# Altium footprint library Connectors.PcbLib: 70 footprints (part 3 of 5)
Each footprint in its own frame and in the unit in brackets; x right, y up, seen from the top. Pads: shape width x height; smd on the part's side, far side on the other; paste and mask are expansions set on the pad; w line width, h text height; cw(c..) or ccw(c..) is an arc to the next point about the centre after c.
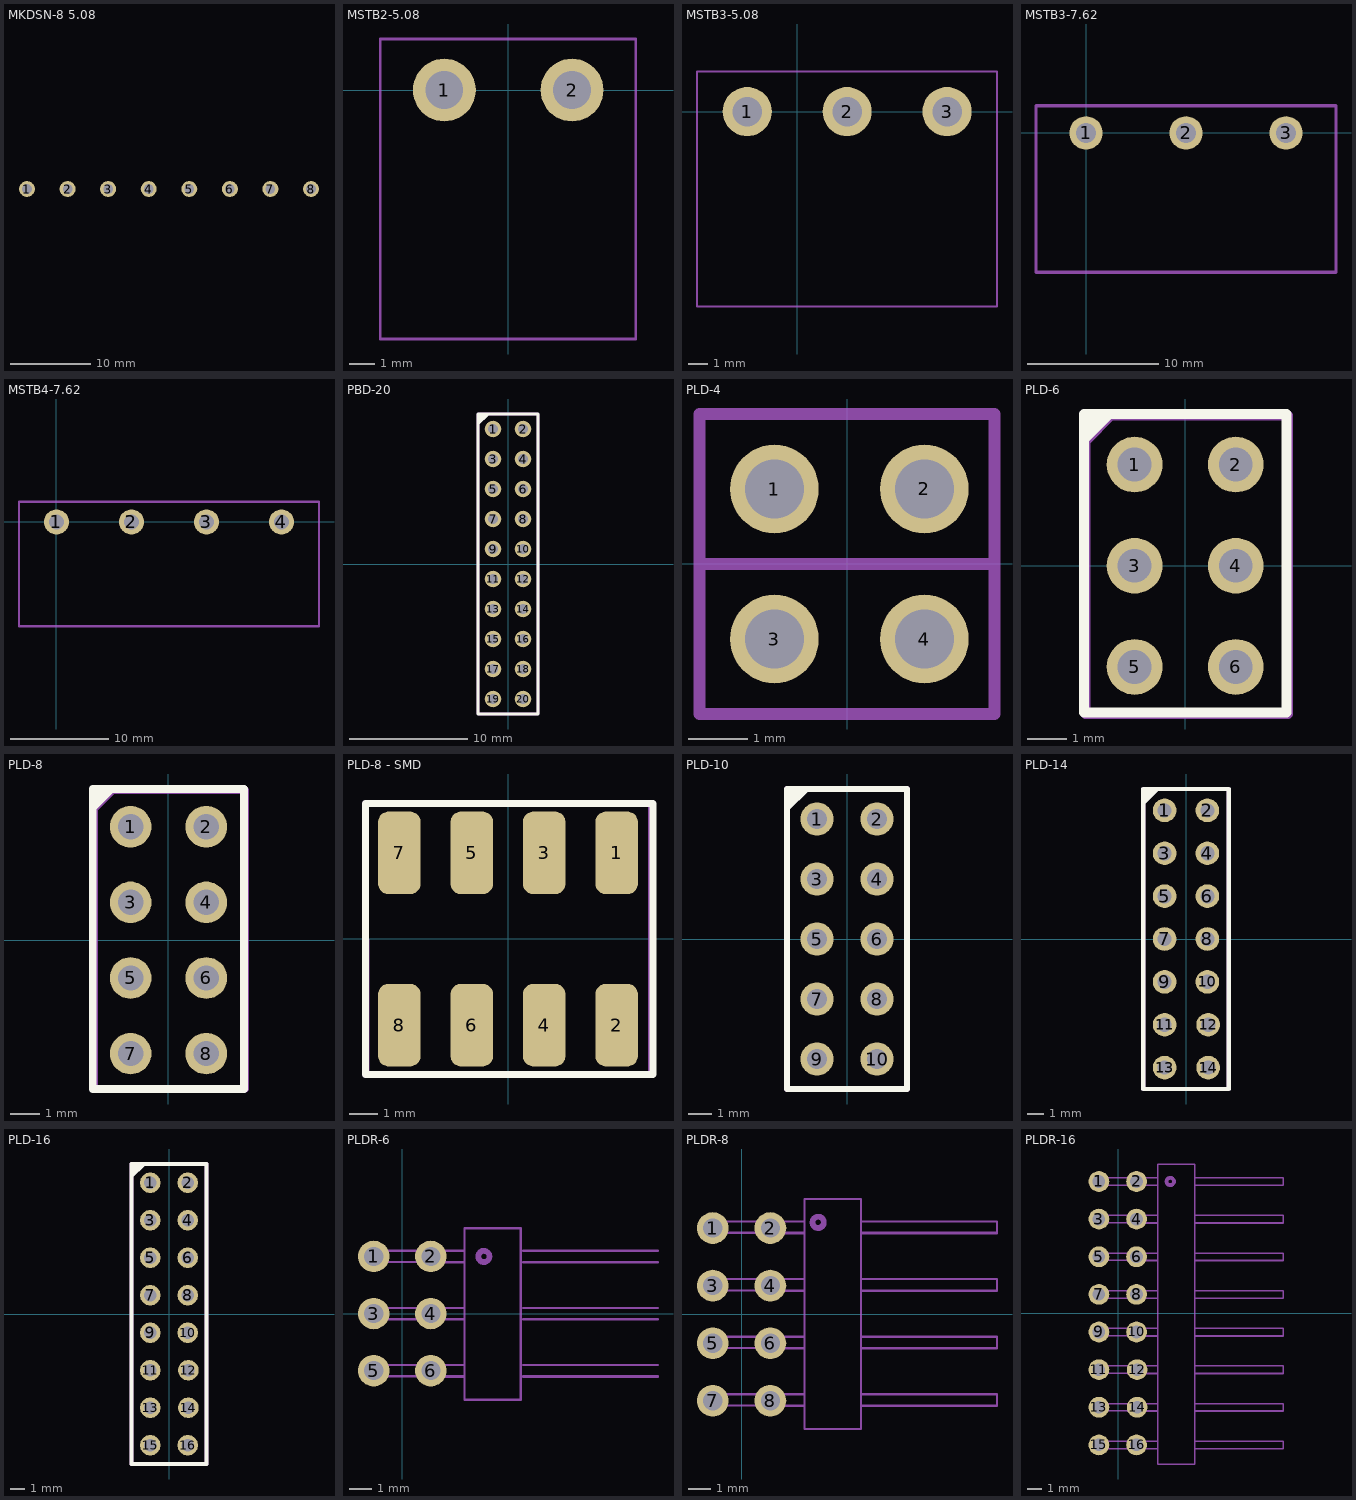
[diagram p2: the footprints below, top view; thin cyan lines are the x and y axes]

## MKDSN-8 5.08 [mm]
pads (8):
  round 2 hole 1.2: 1(-1254.76,-1239.52) 2(-1249.68,-1239.52) 3(-1244.6,-1239.52) 4(-1239.52,-1239.52) 5(-1234.44,-1239.52) 6(-1229.36,-1239.52) 7(-1224.28,-1239.52) 8(-1219.2,-1239.52)
3D body "17433.stp": height 10, standoff -3.5, extent -1257.204,-1243.584 -1215.994,-1235.484

## MSTB2-5.08 [mm]
pads (2):
  round 2.5 hole 1.5: 1(-2.54,0) 2(2.54,0)
Top Assembly:
  lines w0.1: -5.095,-9.906 5.08,-9.906 5.08,2.032 -5.095,2.032 -5.095,-3.276 -5.095,-9.906
3D body "1759017.stp": height 8.6, standoff -3.5, extent -5.08,-9.938 5.08,2.064

## MSTB3-5.08 [mm]
pads (3):
  round 2.5 hole 1.5: 1(-2.54,0) 2(2.54,0) 3(7.62,0)
Top Assembly:
  lines w0.1: -5.095,-9.906 10.16,-9.906 10.16,2.032 -5.095,2.032 -5.095,-3.276 -5.095,-9.906
3D body "1759020.stp": height 8.6, standoff -3.5, extent -5.08,-9.938 10.16,2.064

## MSTB3-7.62 [mm]
pads (3):
  round 2.54 hole 1.5: 1(0,0) 2(7.62,0) 3(15.24,0)
Top Assembly:
  lines w0.254: -3.81,-10.624 19.05,-10.624 19.05,2.076 -3.81,2.076 -3.81,-10.624
3D body "691313410003.stp": height 9.45, standoff -3.05, extent -3.81,-10 19.05,2

## MSTB4-7.62 [mm]
pads (4):
  round 2.54 hole 1.5: 1(0,0) 2(7.62,0) 3(15.24,0) 4(22.86,0)
Top Assembly:
  lines w0.254: -3.81,-10.624 26.67,-10.624 26.67,2.076 -3.81,2.076 -3.81,-10.624
3D body "691313410003.stp": height 9.45, standoff -3.05, extent -3.81,-10 19.05,2
3D body "691313410003.stp": height 9.45, standoff -3.05, extent 3.81,-10 26.67,2

## PBD-20 [mm]
pads (20):
  round 1.4 hole 0.85: 1(-1.27,11.43) 2(1.27,11.43) 3(-1.27,8.89) 4(1.27,8.89) 5(-1.27,6.35) 6(1.27,6.35) 7(-1.27,3.81) 8(1.27,3.81) 9(-1.27,1.27) 10(1.27,1.27) 11(-1.27,-1.27) 12(1.27,-1.27) 13(-1.27,-3.81) 14(1.27,-3.81) 15(-1.27,-6.35) 16(1.27,-6.35) 17(-1.27,-8.89) 18(1.27,-8.89) 19(-1.27,-11.43) 20(1.27,-11.43)
Top Overlay:
  region: -1.55,12.7 -2.54,11.71 -2.54,12.7
  lines w0.254: -2.54,-12.7 2.54,-12.7 2.54,12.7 -2.54,12.7 -2.54,-12.7
Top Assembly:
  lines w0.254: -2.54,-12.7 -2.54,12.7 2.54,12.7 2.54,-12.7 -2.54,-12.7
3D body "User Library-PBD2_54-20.step": height 8.4, standoff -2.7, extent -2.54,-12.7 2.54,12.7

## PLD-4 [mm]
pads (4):
  round 1.5 hole 1: 1(-1.23,1.27) 2(1.31,1.27) 3(-1.23,-1.27) 4(1.31,-1.27)
Top Assembly:
  lines w0.2: -2.5,0 2.5,0 ; -2.5,0 -2.5,-2.54 2.5,-2.54 2.5,0 ; -2.5,0 -2.5,2.54 2.5,2.54 2.5,0 ; -2.5,0 2.5,0
3D body "User Library-PLD-2.step": height 8.5, standoff -3, extent -2.5,-2.54 2.5,0
3D body "User Library-PLD-2.step": height 8.5, standoff -3, extent -2.5,0 2.5,2.54

## PLD-6 [mm]
pads (6):
  round 1.4 hole 0.85: 1(-1.27,2.54) 2(1.27,2.54) 3(-1.27,0) 4(1.27,0) 5(-1.27,-2.54) 6(1.27,-2.54)
Top Overlay:
  lines w0.254: -2.54,3.175 -1.905,3.81 ; -2.54,3.429 -2.159,3.81 ; -2.54,-3.683 -2.54,3.81 2.54,3.81 2.54,-3.683 -2.54,-3.683
Top Assembly:
  lines w0.254: -2.5,3.135 -1.865,3.77 ; -2.5,3.389 -2.119,3.77 ; -2.5,-3.723 2.58,-3.723 2.58,3.77 -2.5,3.77 -2.5,-3.723
3D body "User Library-PLD-2.step": height 8.5, standoff -3, extent -2.5,1.27 2.5,3.81
3D body "User Library-PLD-2.step": height 8.5, standoff -3, extent -2.5,-1.27 2.5,1.27
3D body "User Library-PLD-2.step": height 8.5, standoff -3, extent -2.5,-3.81 2.5,-1.27

## PLD-8 [mm]
pads (8):
  round 1.4 hole 0.85: 1(-1.27,3.81) 2(1.27,3.81) 3(-1.27,1.27) 4(1.27,1.27) 5(-1.27,-1.27) 6(1.27,-1.27) 7(-1.27,-3.81) 8(1.27,-3.81)
Top Overlay:
  lines w0.254: -2.54,4.445 -1.905,5.08 ; -2.54,4.699 -2.159,5.08 ; -2.54,-5 2.54,-5 2.54,5.08 -2.54,5.08 -2.54,-5
Top Assembly:
  lines w0.254: -2.5,4.405 -1.865,5.04 ; -2.5,4.659 -2.119,5.04 ; -2.5,-4.993 2.58,-4.993 2.58,5.04 -2.5,5.04 -2.5,-4.993
3D body "User Library-PLD-2.step": height 8.5, standoff -3, extent -2.5,2.54 2.5,5.08
3D body "User Library-PLD-2.step": height 8.5, standoff -3, extent -2.5,0 2.5,2.54
3D body "User Library-PLD-2.step": height 8.5, standoff -3, extent -2.5,-2.54 2.5,0
3D body "User Library-PLD-2.step": height 8.5, standoff -3, extent -2.5,-5.08 2.5,-2.54

## PLD-8 - SMD [mm]
pads (8):
  rrect50% 1.5x2.9 smd: 1(3.81,3.02) 2(3.81,-3.02) 3(1.27,3.02) 4(1.27,-3.02) 5(-1.27,3.02) 6(-1.27,-3.02) 7(-3.81,3.02) 8(-3.81,-3.02)
Top Overlay:
  lines w0.254: 5.08,-4.75 -5,-4.75 -5,4.75 5.082,4.75 5.082,-4.75
Top Assembly:
  lines w0.254: -5,4.75 -4.992,-4.75 5.04,-4.75 5.04,4.75 -4.993,4.75
3D body "1241050-2.stp": height 10.3, standoff 0.09, extent -0.04,-3.81 5.04,3.81
3D body "1241050-2.stp": height 10.3, standoff 0.09, extent -5.04,-3.81 0.04,3.81

## PLD-10 [mm]
pads (10):
  round 1.4 hole 0.85: 1(-1.27,5.08) 2(1.27,5.08) 3(-1.27,2.54) 4(1.27,2.54) 5(-1.27,0) 6(1.27,0) 7(-1.27,-2.54) 8(1.27,-2.54) 9(-1.27,-5.08) 10(1.27,-5.08)
Top Overlay:
  region: -1.55,6.35 -2.54,5.36 -2.54,6.35
  lines w0.254: -2.54,-6.35 -2.54,6.35 2.54,6.35 2.54,-6.35 -2.54,-6.35
Top Assembly:
  lines w0.254: -2.54,-6.35 -2.54,6.35 2.54,6.35 2.54,-6.35 -2.54,-6.35
3D body "User Library-PLD-2.step": height 8.5, standoff -3, extent -2.46,-3.81 2.54,-1.27
3D body "User Library-PLD-2.step": height 8.5, standoff -3, extent -2.46,-6.35 2.54,-3.81
3D body "User Library-PLD-2.step": height 8.5, standoff -3, extent -2.46,1.27 2.54,3.81
3D body "User Library-PLD-2.step": height 8.5, standoff -3, extent -2.46,-1.27 2.54,1.27
3D body "User Library-PLD-2.step": height 8.5, standoff -3, extent -2.46,3.81 2.54,6.35

## PLD-14 [mm]
pads (14):
  round 1.4 hole 0.85: 1(-1.29,7.62) 2(1.25,7.62) 3(-1.29,5.08) 4(1.25,5.08) 5(-1.29,2.54) 6(1.25,2.54) 7(-1.29,0) 8(1.25,0) 9(-1.29,-2.54) 10(1.25,-2.54) 11(-1.29,-5.08) 12(1.29,-5.08) 13(-1.29,-7.62) 14(1.29,-7.62)
Top Overlay:
  region: -1.57,8.89 -2.56,7.9 -2.56,8.89
  lines w0.254: -2.56,-8.89 -2.56,8.89 2.52,8.89 2.52,-8.89 -2.56,-8.89
Top Assembly:
  lines w0.254: -2.56,-8.89 -2.56,8.89 2.52,8.89 2.52,-8.89 -2.56,-8.89
3D body "User Library-PLD-2.step": height 8.5, standoff -3, extent -2.48,-8.89 2.52,-6.35
3D body "User Library-PLD-2.step": height 8.5, standoff -3, extent -2.48,-6.35 2.52,-3.81
3D body "User Library-PLD-2.step": height 8.5, standoff -3, extent -2.48,-1.27 2.52,1.27
3D body "User Library-PLD-2.step": height 8.5, standoff -3, extent -2.48,-3.81 2.52,-1.27
3D body "User Library-PLD-2.step": height 8.5, standoff -3, extent -2.48,3.81 2.52,6.35
3D body "User Library-PLD-2.step": height 8.5, standoff -3, extent -2.48,1.27 2.52,3.81
3D body "User Library-PLD-2.step": height 8.5, standoff -3, extent -2.48,6.35 2.52,8.89

## PLD-16 [mm]
pads (16):
  round 1.4 hole 0.85: 1(-1.29,8.89) 2(1.25,8.89) 3(-1.29,6.35) 4(1.25,6.35) 5(-1.29,3.81) 6(1.25,3.81) 7(-1.29,1.27) 8(1.25,1.27) 9(-1.29,-1.27) 10(1.25,-1.27) 11(-1.29,-3.81) 12(1.29,-3.81) 13(-1.29,-6.35) 14(1.29,-6.35) 15(-1.29,-8.89) 16(1.25,-8.89)
Top Overlay:
  region: -1.57,10.16 -2.56,9.17 -2.56,10.16
  lines w0.254: -2.56,-10.16 2.52,-10.16 2.52,10.16 -2.56,10.16 -2.56,-10.16
Top Assembly:
  lines w0.254: -2.56,-10.16 2.52,-10.16 2.52,10.16 -2.56,10.16 -2.56,-10.16
3D body "User Library-PLD-2.step": height 8.5, standoff -3, extent -2.48,-10.16 2.52,-7.62
3D body "User Library-PLD-2.step": height 8.5, standoff -3, extent -2.48,7.62 2.52,10.16
3D body "User Library-PLD-2.step": height 8.5, standoff -3, extent -2.48,2.54 2.52,5.08
3D body "User Library-PLD-2.step": height 8.5, standoff -3, extent -2.48,5.08 2.52,7.62
3D body "User Library-PLD-2.step": height 8.5, standoff -3, extent -2.48,-2.54 2.52,0
3D body "User Library-PLD-2.step": height 8.5, standoff -3, extent -2.48,0 2.52,2.54
3D body "User Library-PLD-2.step": height 8.5, standoff -3, extent -2.48,-5.08 2.52,-2.54
3D body "User Library-PLD-2.step": height 8.5, standoff -3, extent -2.48,-7.62 2.52,-5.08

## PLDR-6 [mm]
pads (6):
  round 1.4 hole 0.85: 1(-1.27,2.54) 2(1.27,2.54) 3(-1.27,0) 4(1.27,0) 5(-1.27,-2.54) 6(1.27,-2.54)
Top Assembly:
  circle w0.1: c-1.016,2.54 r0.25
  circle w0.1: c-1.016,0 r0.25
  circle w0.1: c-1.016,-2.54 r0.25
  circle w0.1: c1.397,2.54 r0.25
  circle w0.1: c1.397,0 r0.25
  circle w0.1: c1.397,-2.54 r0.25
  circle w0.254: c3.627,2.54 r0.25
  lines w0.1: 0.73,-2.79 0.73,-2.81 2.77,-2.81 ; 0.73,-0.25 0.73,-0.27 2.77,-0.27 ; 0.73,2.29 0.73,2.27 2.77,2.27 ; 2.77,-2.79 -1.27,-2.79 -1.27,-2.29 2.77,-2.29 ; 2.77,-0.25 -1.27,-0.25 -1.27,0.25 2.77,0.25 ; 2.77,2.29 -1.27,2.29 -1.27,2.79 2.77,2.79 ; 5.373,-2.81 11.373,-2.81 ; 5.373,-2.79 11.373,-2.79 ; 5.373,-2.29 11.373,-2.29 ; 5.373,-0.27 11.373,-0.27 ; 5.373,-0.25 11.373,-0.25 ; 5.373,0.25 11.373,0.25 ; 5.373,2.27 11.373,2.27 ; 5.373,2.29 11.373,2.29 ; 5.373,2.79 11.373,2.79 ; 2.77,-3.83 2.77,3.79 5.27,3.79 5.27,-3.83 2.77,-3.83
3D body "User Library-PLDR-6.step": height 5.25, standoff -2.75, extent -1.27,-3.81 11.27,3.81

## PLDR-8 [mm]
pads (8):
  round 1.4 hole 0.85: 1(-1.27,3.81) 2(1.27,3.81) 3(-1.27,1.27) 4(1.27,1.27) 5(-1.27,-1.27) 6(1.27,-1.27) 7(-1.27,-3.81) 8(1.27,-3.81)
Top Assembly:
  circle w0.254: c3.377,4.06 r0.25
  circle w0.1: c1.397,-1.234 r0.25
  circle w0.1: c1.397,1.306 r0.25
  circle w0.1: c1.397,3.846 r0.25
  circle w0.1: c-1.016,-1.234 r0.25
  circle w0.1: c-1.016,1.306 r0.25
  circle w0.1: c-1.016,3.846 r0.25
  circle w0.1: c1.397,-3.774 r0.25
  circle w0.1: c1.397,-1.234 r0.25
  circle w0.1: c1.397,1.306 r0.25
  circle w0.1: c-1.016,-3.774 r0.25
  circle w0.1: c-1.016,-1.234 r0.25
  circle w0.1: c-1.016,1.306 r0.25
  lines w0.1: 0.73,-4.024 0.73,-4.044 2.77,-4.044 ; 0.73,3.596 0.73,3.576 2.77,3.576 ; 2.77,-4.024 -1.27,-4.024 -1.27,-3.524 2.77,-3.524 ; 2.77,-2.524 2.77,5.096 5.27,5.096 5.27,-2.524 ; 2.77,2.556 2.77,-5.064 5.27,-5.064 5.27,2.556 ; 2.77,3.596 -1.27,3.596 -1.27,4.096 2.77,4.096 ; 5.27,-4.044 11.27,-4.044 11.27,-4.024 ; 5.27,-4.024 11.27,-4.024 ; 5.27,-3.524 11.27,-3.524 11.27,-4.024 ; 5.27,3.576 11.27,3.576 11.27,3.596 ; 5.27,3.596 11.27,3.596 ; 5.27,4.096 11.27,4.096 11.27,3.596 ; -1.27,-1.484 2.77,-1.484 -1.27,-1.484 ; -1.27,-1.484 -1.27,-0.984 ; -1.27,-1.484 -1.27,-0.984 ; -1.27,-0.984 2.77,-0.984 -1.27,-0.984 ; -1.27,1.056 2.77,1.056 -1.27,1.056 ; -1.27,1.056 -1.27,1.556 ; -1.27,1.056 -1.27,1.556 ; -1.27,1.556 2.77,1.556 -1.27,1.556 ; 0.73,-1.504 0.73,-1.484 0.73,-1.504 ; 0.73,-1.504 2.77,-1.504 0.73,-1.504 ; 0.73,1.036 0.73,1.056 0.73,1.036 ; 0.73,1.036 2.77,1.036 0.73,1.036 ; 11.27,-1.504 11.27,-1.484 ; 11.27,-1.504 5.27,-1.504 11.27,-1.504 ; 11.27,-1.504 11.27,-1.484 ; 11.27,-1.484 11.27,-0.984 ; 11.27,-1.484 5.27,-1.484 11.27,-1.484 ; 11.27,-1.484 11.27,-0.984 ; 11.27,-0.984 5.27,-0.984 11.27,-0.984 ; 11.27,1.036 11.27,1.056 ; 11.27,1.036 5.27,1.036 11.27,1.036 ; 11.27,1.036 11.27,1.056 ; 11.27,1.056 5.27,1.056 11.27,1.056 ; 11.27,1.056 11.27,1.556 ; 11.27,1.056 11.27,1.556 ; 11.27,1.556 5.27,1.556 11.27,1.556
3D body "User Library-PLDR-6.step": height 5.75, standoff -2.25, extent -1.333,-2.527 11.207,5.093
3D body "User Library-PLDR-6.step": height 5.75, standoff -2.25, extent -1.333,-5.067 11.207,2.553

## PLDR-16 [mm]
pads (16):
  round 1.4 hole 0.85: 1(-1.29,8.89) 2(1.25,8.89) 3(-1.29,6.35) 4(1.25,6.35) 5(-1.29,3.81) 6(1.25,3.81) 7(-1.29,1.27) 8(1.25,1.27) 9(-1.29,-1.27) 10(1.25,-1.27) 11(-1.29,-3.81) 12(1.29,-3.81) 13(-1.29,-6.35) 14(1.29,-6.35) 15(-1.29,-8.89) 16(1.25,-8.89)
Top Assembly:
  circle w0.254: c3.524,8.89 r0.25
  circle w0.1: c1.294,-8.89 r0.25
  circle w0.1: c1.294,-6.35 r0.25
  circle w0.1: c1.294,-3.81 r0.25
  circle w0.1: c1.294,-1.27 r0.25
  circle w0.1: c1.294,1.27 r0.25
  circle w0.1: c1.294,3.81 r0.25
  circle w0.1: c1.294,6.35 r0.25
  circle w0.1: c1.294,8.89 r0.25
  circle w0.1: c-1.119,-8.89 r0.25
  circle w0.1: c-1.119,-6.35 r0.25
  circle w0.1: c-1.119,-3.81 r0.25
  circle w0.1: c-1.119,-1.27 r0.25
  circle w0.1: c-1.119,1.247 r0.25
  circle w0.1: c-1.119,3.81 r0.25
  circle w0.1: c-1.119,6.35 r0.25
  circle w0.1: c-1.119,8.89 r0.25
  lines w0.1: 0.627,-9.14 0.627,-9.16 2.667,-9.16 ; 0.627,-6.6 0.627,-6.62 2.667,-6.62 ; 0.627,-4.06 0.627,-4.08 2.667,-4.08 ; 0.627,-1.52 0.627,-1.54 2.667,-1.54 ; 0.627,1.02 0.627,1 2.667,1 ; 0.627,3.56 0.627,3.54 2.667,3.54 ; 0.627,6.1 0.627,6.08 2.667,6.08 ; 2.667,-9.14 -1.373,-9.14 -1.373,-8.64 2.667,-8.64 ; 2.667,-6.6 -1.373,-6.6 -1.373,-6.1 2.667,-6.1 ; 2.667,-4.06 -1.373,-4.06 -1.373,-3.56 2.667,-3.56 ; 2.667,-1.52 -1.373,-1.52 -1.373,-1.02 2.667,-1.02 ; 2.667,1.02 -1.373,1.02 -1.373,1.52 2.667,1.52 ; 2.667,3.56 -1.373,3.56 -1.373,4.06 2.667,4.06 ; 2.667,6.1 -1.373,6.1 -1.373,6.6 2.667,6.6 ; 2.667,10.05 5.167,10.05 5.167,-2.56 5.167,-10.18 2.667,-10.18 2.667,-2.56 2.667,10.07 ; 5.167,-9.16 11.167,-9.16 11.167,-9.14 ; 5.167,-9.14 11.167,-9.14 ; 5.167,-8.64 11.167,-8.64 11.167,-9.14 ; 5.167,-6.62 11.167,-6.62 11.167,-6.6 ; 5.167,-6.6 11.167,-6.6 ; 5.167,-6.1 11.167,-6.1 11.167,-6.6 ; 5.167,-4.08 11.167,-4.08 11.167,-4.06 ; 5.167,-4.06 11.167,-4.06 ; 5.167,-3.56 11.167,-3.56 11.167,-4.06 ; 5.167,-1.54 11.167,-1.54 11.167,-1.52 ; 5.167,-1.52 11.167,-1.52 ; 5.167,-1.02 11.167,-1.02 11.167,-1.52 ; 5.167,1 11.167,1 11.167,1.02 ; 5.167,1.02 11.167,1.02 ; 5.167,1.52 11.167,1.52 11.167,1.02 ; 5.167,3.54 11.167,3.54 11.167,3.56 ; 5.167,3.56 11.167,3.56 ; 5.167,4.06 11.167,4.06 11.167,3.56 ; 5.167,6.08 11.167,6.08 11.167,6.1 ; 5.167,6.1 11.167,6.1 ; 5.167,6.6 11.167,6.6 11.167,6.1 ; -1.373,8.64 -1.373,9.14 ; -1.373,8.64 -1.373,9.14 ; -1.373,8.64 2.667,8.64 -1.373,8.64 ; -1.373,9.14 2.667,9.14 -1.373,9.14 ; 0.627,8.62 0.627,8.64 0.627,8.62 ; 0.627,8.62 2.667,8.62 0.627,8.62 ; 11.167,8.62 11.167,8.64 ; 11.167,8.62 11.167,8.64 ; 11.167,8.62 5.167,8.62 11.167,8.62 ; 11.167,8.64 11.167,9.14 ; 11.167,8.64 11.167,9.14 ; 11.167,8.64 5.167,8.64 11.167,8.64 ; 11.167,9.14 5.167,9.14 11.167,9.14
3D body "User Library-PLDR-6.step": height 5.25, standoff -2.75, extent -1.436,2.517 11.104,10.137
3D body "User Library-PLDR-6.step": height 5.25, standoff -2.75, extent -1.436,-10.183 11.104,-2.563
3D body "User Library-PLDR-6.step": height 5.25, standoff -2.75, extent -1.436,-2.563 11.104,5.057